# Altium footprint library Components.PcbLib: 260 footprints (part 3 of 17)
Each footprint in its own frame and in the unit in brackets; x right, y up, seen from the top. Pads: shape width x height; smd on the part's side, far side on the other; paste and mask are expansions set on the pad; w line width, h text height; cw(c..) or ccw(c..) is an arc to the next point about the centre after c.
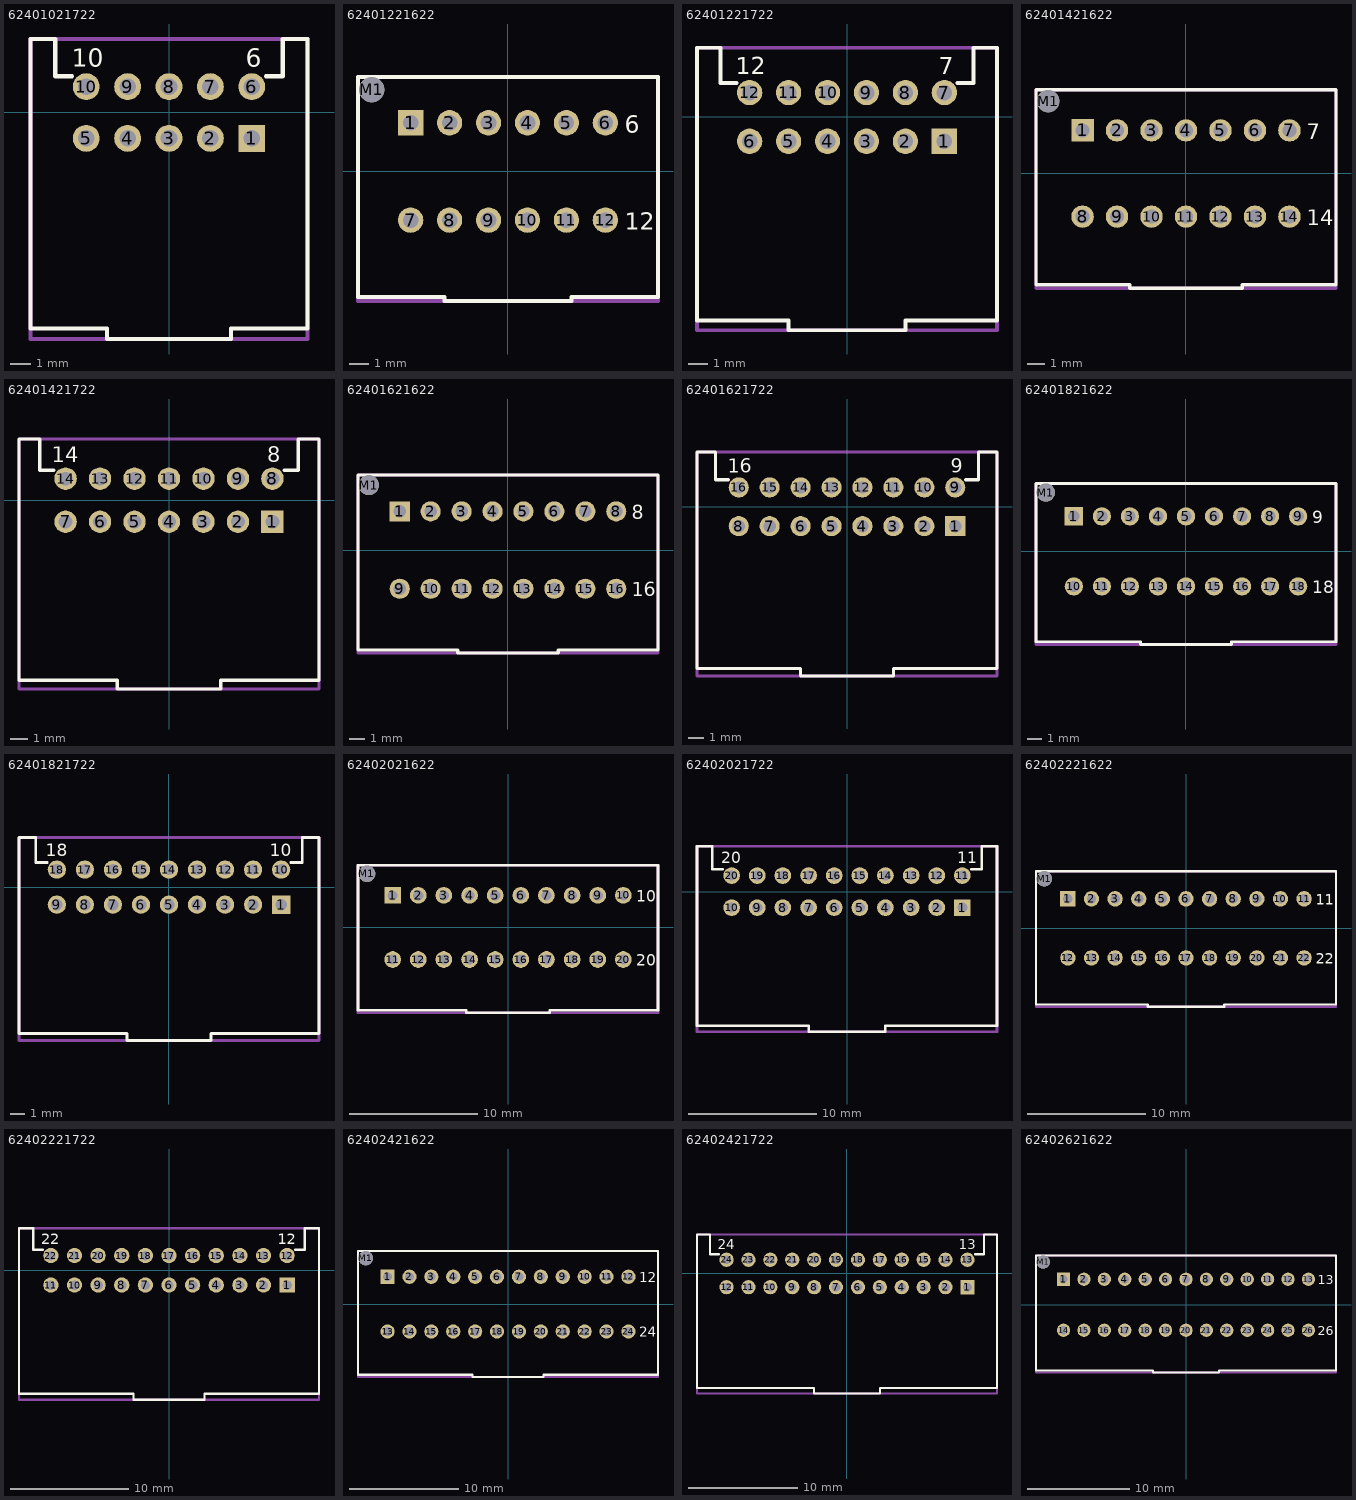
[diagram p2: the footprints below, top view; thin cyan lines are the x and y axes]

## 62401021722 [mm] "2.00mm Male Dual Row Horizontal Shrouded Header with positive locking, 10p"
height 11.7
pads (10):
  rect 1.3x1.3 hole 0.8: 1(4,-1.25)
  round 1.3 hole 0.8: 2(2,-1.25) 3(0,-1.25) 4(-2,-1.25) 5(-4,-1.25) 6(4,1.25) 7(2,1.25) 8(0,1.25) 9(-2,1.25) 10(-4,1.25)
Top Overlay:
  lines w0.2: -4.68,1.75 -5.5,1.75 -5.5,3.55 -6.7,3.55 -6.7,-10.45 -3,-10.45 -3,-10.95 3,-10.95 3,-10.45 6.7,-10.45 6.7,3.55 5.5,3.55 5.5,1.75 4.68,1.75
  text "6" at 3.7,2.2 h0.89
  text "10" at -4.7,2.2 h0.89
Mechanical 13:
  lines w0.2: -6.7,-10.95 -6.7,3.55 6.7,3.55 6.7,-10.95 -6.7,-10.95
3D body "62401021722.stp": height 11.75, standoff -3.15, extent -6.7,-10.95 6.7,3.55

## 62401221622 [mm] "2.00mm Male Dual Row Vertical Shrouded Header with positive locking, 12p"
height 11.6
pads (13):
  rect 1.3x1.3 hole 0.8: 1(-5,2.5)
  round 1.3 hole 0.8: 2(-3,2.5) 3(-1,2.5) 4(1,2.5) 5(3,2.5) 6(5,2.5) 7(-5,-2.5) 8(-3,-2.5) 9(-1,-2.5) 10(1,-2.5) 11(3,-2.5) 12(5,-2.5)
  round 1.3 hole 1.3 unplated: M1(-7,4.2)
Top Overlay:
  lines w0.2: -7.7,-6.45 -7.7,4.85 7.7,4.85 7.7,-6.45 3.25,-6.45 3.25,-6.65 -3.25,-6.65 -3.25,-6.45 -7.7,-6.45
  text "12" at 6,-3 h0.89
  text "6" at 6,2 h0.89
Mechanical 13:
  lines w0.2: -7.7,-6.65 -7.7,4.85 7.7,4.85 7.7,-6.65 -7.7,-6.65
3D body "62401221622.stp": height 9.82, standoff -3.13, extent -7.7,-6.65 7.7,4.85

## 62401221722 [mm] "2.00mm Male Dual Row Horizontal Shrouded Header with positive locking, 12p"
height 11.7
pads (12):
  rect 1.3x1.3 hole 0.8: 1(5,-1.25)
  round 1.3 hole 0.8: 2(3,-1.25) 3(1,-1.25) 4(-1,-1.25) 5(-3,-1.25) 6(-5,-1.25) 7(5,1.25) 8(3,1.25) 9(1,1.25) 10(-1,1.25) 11(-3,1.25) 12(-5,1.25)
Top Overlay:
  lines w0.2: -5.68,1.75 -6.5,1.75 -6.5,3.55 -7.7,3.55 -7.7,-10.45 -3,-10.45 -3,-10.95 3,-10.95 3,-10.45 7.7,-10.45 7.7,3.55 6.5,3.55 6.5,1.75 5.68,1.75
  text "7" at 4.7,2.2 h0.89
  text "12" at -5.7,2.2 h0.89
Mechanical 13:
  lines w0.2: -7.7,-10.95 7.7,-10.95 7.7,3.55 -7.7,3.55 -7.7,-10.95
3D body "62401221722.stp": height 11.75, standoff -3.15, extent -7.7,-10.95 7.7,3.55

## 62401421622 [mm] "2.00mm Male Dual Row Vertical Shrouded Header with positive locking, 14p"
height 11.6
pads (15):
  rect 1.3x1.3 hole 0.8: 1(-6,2.5)
  round 1.3 hole 0.8: 2(-4,2.5) 3(-2,2.5) 4(0,2.5) 5(2,2.5) 6(4,2.5) 7(6,2.5) 8(-6,-2.5) 9(-4,-2.5) 10(-2,-2.5) 11(0,-2.5) 12(2,-2.5) 13(4,-2.5) 14(6,-2.5)
  round 1.3 hole 1.3 unplated: M1(-8,4.2)
Top Overlay:
  lines w0.2: -8.7,-6.45 -3.25,-6.45 -3.25,-6.65 3.25,-6.65 3.25,-6.45 8.7,-6.45 8.7,4.85 -8.7,4.85 -8.7,-6.45
  text "14" at 7,-3 h0.89
  text "7" at 7,2 h0.89
Mechanical 13:
  lines w0.2: -8.7,-6.65 -8.7,4.85 8.7,4.85 8.7,-6.65 -8.7,-6.65
3D body "62401421622.stp": height 9.82, standoff -3.13, extent -8.7,-6.65 8.7,4.85

## 62401421722 [mm] "2.00mm Male Dual Row Horizontal Shrouded Header with positive locking, 14p"
height 11.7
pads (14):
  rect 1.3x1.3 hole 0.8: 1(6,-1.25)
  round 1.3 hole 0.8: 2(4,-1.25) 3(2,-1.25) 4(0,-1.25) 5(-2,-1.25) 6(-4,-1.25) 7(-6,-1.25) 8(6,1.25) 9(4,1.25) 10(2,1.25) 11(0,1.25) 12(-2,1.25) 13(-4,1.25) 14(-6,1.25)
Top Overlay:
  lines w0.2: -6.68,1.75 -7.5,1.75 -7.5,3.55 -8.7,3.55 -8.7,-10.45 -3,-10.45 -3,-10.95 3,-10.95 3,-10.45 8.7,-10.45 8.7,3.55 7.5,3.55 7.5,1.75 6.68,1.75
  text "8" at 5.7,2.2 h0.89
  text "14" at -6.8,2.2 h0.89
Mechanical 13:
  lines w0.2: -8.7,-10.95 8.7,-10.95 8.7,3.55 -8.7,3.55 -8.7,-10.95
3D body "62401421722.stp": height 11.75, standoff -3.15, extent -8.7,-10.95 8.7,3.55

## 62401621622 [mm] "2.00mm Male Dual Row Vertical Shrouded Header with positive locking, 16p"
height 11.6
pads (17):
  rect 1.3x1.3 hole 0.8: 1(-7,2.5)
  round 1.3 hole 0.8: 2(-5,2.5) 3(-3,2.5) 4(-1,2.5) 5(1,2.5) 6(3,2.5) 7(5,2.5) 8(7,2.5) 9(-7,-2.5) 10(-5,-2.5) 11(-3,-2.5) 12(-1,-2.5) 13(1,-2.5) 14(3,-2.5) 15(5,-2.5) 16(7,-2.5)
  round 1.3 hole 1.3 unplated: M1(-9,4.2)
Top Overlay:
  lines w0.2: -9.7,-6.45 -3.25,-6.45 -3.25,-6.65 3.25,-6.65 3.25,-6.45 9.7,-6.45 9.7,4.85 -9.7,4.85 -9.7,-6.45
  text "16" at 8,-3 h0.89
  text "8" at 8,2 h0.89
Mechanical 13:
  lines w0.2: -9.7,-6.65 -9.7,4.85 9.7,4.85 9.7,-6.65 -9.7,-6.65
3D body "62401621622.stp": height 9.82, standoff -3.13, extent -9.7,-6.65 9.7,4.85

## 62401621722 [mm] "2.00mm Male Dual Row Horizontal Shrouded Header with positive locking, 16p"
height 11.7
pads (16):
  rect 1.3x1.3 hole 0.8: 1(7,-1.25)
  round 1.3 hole 0.8: 2(5,-1.25) 3(3,-1.25) 4(1,-1.25) 5(-1,-1.25) 6(-3,-1.25) 7(-5,-1.25) 8(-7,-1.25) 9(7,1.25) 10(5,1.25) 11(3,1.25) 12(1,1.25) 13(-1,1.25) 14(-3,1.25) 15(-5,1.25) 16(-7,1.25)
Top Overlay:
  lines w0.2: -7.68,1.75 -8.5,1.75 -8.5,3.55 -9.7,3.55 -9.7,-10.45 -3,-10.45 -3,-10.95 3,-10.95 3,-10.45 9.7,-10.45 9.7,3.55 8.5,3.55 8.5,1.75 7.68,1.75
  text "9" at 6.7,2.2 h0.89
  text "16" at -7.7,2.2 h0.89
Mechanical 13:
  lines w0.2: -9.7,-10.95 -9.7,3.55 9.7,3.55 9.7,-10.95 -9.7,-10.95
3D body "62401621722.stp": height 11.75, standoff -3.15, extent -9.7,-10.95 9.7,3.55

## 62401821622 [mm] "2.00mm Male Dual Row Vertical Shrouded Header with positive locking, 18p"
height 11.6
pads (19):
  rect 1.3x1.3 hole 0.8: 1(-8,2.5)
  round 1.3 hole 0.8: 2(-6,2.5) 3(-4,2.5) 4(-2,2.5) 5(0,2.5) 6(2,2.5) 7(4,2.5) 8(6,2.5) 9(8,2.5) 10(-8,-2.5) 11(-6,-2.5) 12(-4,-2.5) 13(-2,-2.5) 14(0,-2.5) 15(2,-2.5) 16(4,-2.5) 17(6,-2.5) 18(8,-2.5)
  round 1.3 hole 1.3 unplated: M1(-10,4.2)
Top Overlay:
  lines w0.2: -10.7,-6.45 -10.7,4.85 10.7,4.85 10.7,-6.45 3.25,-6.45 3.25,-6.65 -3.25,-6.65 -3.25,-6.45 -10.7,-6.45
  text "18" at 9,-3 h0.89
  text "9" at 9,2 h0.89
Mechanical 13:
  lines w0.2: -10.7,-6.65 10.7,-6.65 10.7,4.85 -10.7,4.85 -10.7,-6.65
3D body "62401821622.stp": height 9.82, standoff -3.13, extent -10.7,-6.65 10.7,4.85

## 62401821722 [mm] "2.00mm Male Dual Row Horizontal Shrouded Header with positive locking, 18p"
height 11.7
pads (18):
  rect 1.3x1.3 hole 0.8: 1(8,-1.25)
  round 1.3 hole 0.8: 2(6,-1.25) 3(4,-1.25) 4(2,-1.25) 5(0,-1.25) 6(-2,-1.25) 7(-4,-1.25) 8(-6,-1.25) 9(-8,-1.25) 10(8,1.25) 11(6,1.25) 12(4,1.25) 13(2,1.25) 14(0,1.25) 15(-2,1.25) 16(-4,1.25) 17(-6,1.25) 18(-8,1.25)
Top Overlay:
  lines w0.2: -8.68,1.75 -9.5,1.75 -9.5,3.55 -10.7,3.55 -10.7,-10.45 -3,-10.45 -3,-10.95 3,-10.95 3,-10.45 10.7,-10.45 10.7,3.55 9.5,3.55 9.5,1.75 8.68,1.75
  text "10" at 7.2,2.2 h0.89
  text "18" at -8.8,2.2 h0.89
Mechanical 13:
  lines w0.2: -10.7,-10.95 10.7,-10.95 10.7,3.55 -10.7,3.55 -10.7,-10.95
3D body "62401821722.stp": height 11.75, standoff -3.15, extent -10.7,-10.95 10.7,3.55

## 62402021622 [mm] "2.00mm Male Dual Row Vertical Shrouded Header with positive locking, 20p"
height 11.6
pads (21):
  rect 1.3x1.3 hole 0.8: 1(-9,2.5)
  round 1.3 hole 0.8: 2(-7,2.5) 3(-5,2.5) 4(-3,2.5) 5(-1,2.5) 6(1,2.5) 7(3,2.5) 8(5,2.5) 9(7,2.5) 10(9,2.5) 11(-9,-2.5) 12(-7,-2.5) 13(-5,-2.5) 14(-3,-2.5) 15(-1,-2.5) 16(1,-2.5) 17(3,-2.5) 18(5,-2.5) 19(7,-2.5) 20(9,-2.5)
  round 1.3 hole 1.3 unplated: M1(-11,4.2)
Top Overlay:
  lines w0.2: -11.7,-6.45 -11.7,4.85 11.7,4.85 11.7,-6.45 3.25,-6.45 3.25,-6.65 -3.25,-6.65 -3.25,-6.45 -11.7,-6.45
  text "20" at 10,-3 h0.89
  text "10" at 10,2 h0.89
Mechanical 13:
  lines w0.2: -11.7,-6.65 -11.7,4.85 11.7,4.85 11.7,-6.65 -11.7,-6.65
3D body "62402021622.stp": height 9.82, standoff -3.13, extent -11.7,-6.65 11.7,4.85

## 62402021722 [mm] "2.00mm Male Dual Row Horizontal Shrouded Header with positive locking, 20p"
height 11.7
pads (20):
  rect 1.3x1.3 hole 0.8: 1(9,-1.25)
  round 1.3 hole 0.8: 2(7,-1.25) 3(5,-1.25) 4(3,-1.25) 5(1,-1.25) 6(-1,-1.25) 7(-3,-1.25) 8(-5,-1.25) 9(-7,-1.25) 10(-9,-1.25) 11(9,1.25) 12(7,1.25) 13(5,1.25) 14(3,1.25) 15(1,1.25) 16(-1,1.25) 17(-3,1.25) 18(-5,1.25) 19(-7,1.25) 20(-9,1.25)
Top Overlay:
  lines w0.2: -9.68,1.75 -10.5,1.75 -10.5,3.55 -11.7,3.55 -11.7,-10.45 -3,-10.45 -3,-10.95 3,-10.95 3,-10.45 11.7,-10.45 11.7,3.55 10.5,3.55 10.5,1.75 9.68,1.75
  text "11" at 8.6,2.2 h0.89
  text "20" at -9.8,2.2 h0.89
Mechanical 13:
  lines w0.2: -11.7,-10.95 11.7,-10.95 11.7,3.55 -11.7,3.55 -11.7,-10.95
3D body "62402021722.stp": height 11.75, standoff -3.15, extent -11.7,-10.95 11.7,3.55

## 62402221622 [mm] "2.00mm Male Dual Row Vertical Shrouded Header with positive locking, 22p"
height 11.6
pads (23):
  rect 1.3x1.3 hole 0.8: 1(-10,2.5)
  round 1.3 hole 0.8: 2(-8,2.5) 3(-6,2.5) 4(-4,2.5) 5(-2,2.5) 6(0,2.5) 7(2,2.5) 8(4,2.5) 9(6,2.5) 10(8,2.5) 11(10,2.5) 12(-10,-2.5) 13(-8,-2.5) 14(-6,-2.5) 15(-4,-2.5) 16(-2,-2.5) 17(0,-2.5) 18(2,-2.5) 19(4,-2.5) 20(6,-2.5) 21(8,-2.5) 22(10,-2.5)
  round 1.3 hole 1.3 unplated: M1(-12,4.2)
Top Overlay:
  lines w0.2: -12.7,-6.45 -3.25,-6.45 -3.25,-6.65 3.25,-6.65 3.25,-6.45 12.7,-6.45 12.7,4.85 -12.7,4.85 -12.7,-6.45
  text "22" at 11,-3 h0.89
  text "11" at 11,2 h0.89
Mechanical 13:
  lines w0.2: -12.7,-6.65 -12.7,4.85 12.7,4.85 12.7,-6.65 -12.7,-6.65
3D body "62402221622.stp": height 9.82, standoff -3.13, extent -12.7,-6.65 12.7,4.85

## 62402221722 [mm] "2.00mm Male Dual Row Horizontal Shrouded Header with positive locking, 22p"
height 11.7
pads (22):
  rect 1.3x1.3 hole 0.8: 1(10,-1.25)
  round 1.3 hole 0.8: 2(8,-1.25) 3(6,-1.25) 4(4,-1.25) 5(2,-1.25) 6(0,-1.25) 7(-2,-1.25) 8(-4,-1.25) 9(-6,-1.25) 10(-8,-1.25) 11(-10,-1.25) 12(10,1.25) 13(8,1.25) 14(6,1.25) 15(4,1.25) 16(2,1.25) 17(0,1.25) 18(-2,1.25) 19(-4,1.25) 20(-6,1.25) 21(-8,1.25) 22(-10,1.25)
Top Overlay:
  lines w0.2: -10.68,1.75 -11.5,1.75 -11.5,3.55 -12.7,3.55 -12.7,-10.45 -3,-10.45 -3,-10.95 3,-10.95 3,-10.45 12.7,-10.45 12.7,3.55 11.5,3.55 11.5,1.75 10.68,1.75
  text "12" at 9.2,2.2 h0.89
  text "22" at -10.8,2.2 h0.89
Mechanical 13:
  lines w0.2: -12.7,-10.95 -12.7,3.55 12.7,3.55 12.7,-10.95 -12.7,-10.95
3D body "62402221722.stp": height 11.75, standoff -3.15, extent -12.7,-10.95 12.7,3.55

## 62402421622 [mm] "2.00mm Male Dual Row Vertical Shrouded Header with positive locking, 24p"
height 11.6
pads (25):
  rect 1.3x1.3 hole 0.8: 1(-11,2.5)
  round 1.3 hole 0.8: 2(-9,2.5) 3(-7,2.5) 4(-5,2.5) 5(-3,2.5) 6(-1,2.5) 7(1,2.5) 8(3,2.5) 9(5,2.5) 10(7,2.5) 11(9,2.5) 12(11,2.5) 13(-11,-2.5) 14(-9,-2.5) 15(-7,-2.5) 16(-5,-2.5) 17(-3,-2.5) 18(-1,-2.5) 19(1,-2.5) 20(3,-2.5) 21(5,-2.5) 22(7,-2.5) 23(9,-2.5) 24(11,-2.5)
  round 1.3 hole 1.3 unplated: M1(-13,4.2)
Top Overlay:
  lines w0.2: -13.7,-6.45 -3.25,-6.45 -3.25,-6.65 3.25,-6.65 3.25,-6.45 13.7,-6.45 13.7,4.85 -13.7,4.85 -13.7,-6.45
  text "24" at 12,-3 h0.89
  text "12" at 12,2 h0.89
Mechanical 13:
  lines w0.2: -13.7,-6.65 -13.7,4.85 13.7,4.85 13.7,-6.65 -13.7,-6.65
3D body "62402421622.stp": height 9.82, standoff -3.13, extent -13.7,-6.65 13.7,4.85

## 62402421722 [mm] "2.00mm Male Dual Row Horizontal Shrouded Header with positive locking, 24p"
height 11.7
pads (24):
  rect 1.3x1.3 hole 0.8: 1(11,-1.25)
  round 1.3 hole 0.8: 2(9,-1.25) 3(7,-1.25) 4(5,-1.25) 5(3,-1.25) 6(1,-1.25) 7(-1,-1.25) 8(-3,-1.25) 9(-5,-1.25) 10(-7,-1.25) 11(-9,-1.25) 12(-11,-1.25) 13(11,1.25) 14(9,1.25) 15(7,1.25) 16(5,1.25) 17(3,1.25) 18(1,1.25) 19(-1,1.25) 20(-3,1.25) 21(-5,1.25) 22(-7,1.25) 23(-9,1.25) 24(-11,1.25)
Top Overlay:
  lines w0.2: -11.68,1.75 -12.5,1.75 -12.5,3.55 -13.7,3.55 -13.7,-10.45 -3,-10.45 -3,-10.95 3,-10.95 3,-10.45 13.7,-10.45 13.7,3.55 12.5,3.55 12.5,1.75 11.68,1.75
  text "13" at 10.2,2.2 h0.89
  text "24" at -11.8,2.2 h0.89
Mechanical 13:
  lines w0.2: -13.7,-10.95 -13.7,3.55 13.7,3.55 13.7,-10.95 -13.7,-10.95
3D body "62402421722.stp": height 11.75, standoff -3.15, extent -13.7,-10.95 13.7,3.55

## 62402621622 [mm] "2.00mm Male Dual Row Vertical Shrouded Header with positive locking, 26p"
height 11.6
pads (27):
  rect 1.3x1.3 hole 0.8: 1(-12,2.5)
  round 1.3 hole 0.8: 2(-10,2.5) 3(-8,2.5) 4(-6,2.5) 5(-4,2.5) 6(-2,2.5) 7(0,2.5) 8(2,2.5) 9(4,2.5) 10(6,2.5) 11(8,2.5) 12(10,2.5) 13(12,2.5) 14(-12,-2.5) 15(-10,-2.5) 16(-8,-2.5) 17(-6,-2.5) 18(-4,-2.5) 19(-2,-2.5) 20(0,-2.5) 21(2,-2.5) 22(4,-2.5) 23(6,-2.5) 24(8,-2.5) 25(10,-2.5) 26(12,-2.5)
  round 1.3 hole 1.3 unplated: M1(-14,4.2)
Top Overlay:
  lines w0.2: -14.7,-6.45 -3.25,-6.45 -3.25,-6.65 3.25,-6.65 3.25,-6.45 14.7,-6.45 14.7,4.85 -14.7,4.85 -14.7,-6.45
  text "26" at 12.9,-3 h0.89
  text "13" at 12.9,2 h0.89
Mechanical 13:
  lines w0.2: -14.7,-6.65 14.7,-6.65 14.7,4.85 -14.7,4.85 -14.7,-6.65
3D body "62402621622.stp": height 9.82, standoff -3.13, extent -14.7,-6.65 14.7,4.85